# Altium integrated library Jesse_Library.IntLib: 1084 symbols (part 1 of 5) (continued)
## WJ500V_4PIN 5.08 (continued)
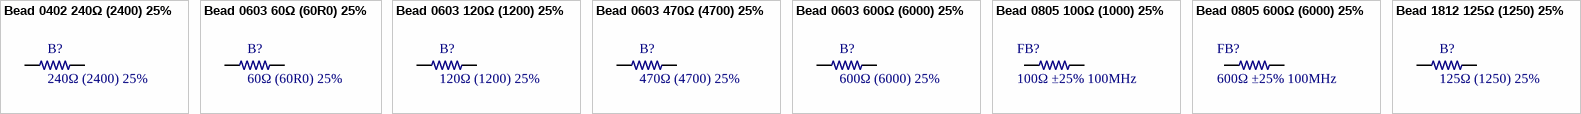
[diagram p4: symbols Bead 0402 240Ω (2400) 25% to Bead 1812 125Ω (1250) 25%]

## Bead 0402 240Ω (2400) 25%
designator B?, comment 240Ω (2400) 25%
贴片磁珠; Package: 0603; Supplier: LC; SuppliersPartNumber: C25803; ComponentLink1Description: 立创商城链接; ComponentLink1URL: https://item.szlcsc.com/266440.html
footprint 0402_L
pins: 1, 2

## Bead 0603 60Ω (60R0) 25%
designator B?, comment 60Ω (60R0) 25%
贴片磁珠; Package: 0603; Supplier: LC; SuppliersPartNumber: C25803; ComponentLink1Description: 立创商城链接; ComponentLink1URL: https://item.szlcsc.com/36300.html
footprint 0603_L
pins: 1, 2

## Bead 0603 120Ω (1200) 25%
designator B?, comment 120Ω (1200) 25%
贴片磁珠; Package: 0603; Supplier: LC; SuppliersPartNumber: C25803; ComponentLink1Description: 立创商城链接; ComponentLink1URL: https://item.szlcsc.com/19227.html
footprint 0603_L
pins: 1, 2

## Bead 0603 470Ω (4700) 25%
designator B?, comment 470Ω (4700) 25%
贴片磁珠; Package: 0603; Supplier: LC; SuppliersPartNumber: C25803; ComponentLink1Description: 立创商城链接; ComponentLink1URL: https://item.szlcsc.com/336340.html
footprint 0603_L
pins: 1, 2

## Bead 0603 600Ω (6000) 25%
designator B?, comment 600Ω (6000) 25%
贴片磁珠; Package: 0603; Supplier: LC; SuppliersPartNumber: C25803; ComponentLink1Description: 立创商城链接; ComponentLink1URL: https://item.szlcsc.com/1354.html
footprint 0603_L
pins: 1, 2

## Bead 0805 100Ω (1000) 25%
designator FB?, comment 100Ω ±25% 100MHz
贴片磁珠; Package: 0805; Supplier: LC; SuppliersPartNumber: C1015; ComponentLink1Description: 立创商城链接; ComponentLink1URL: https://item.szlcsc.com/1367.html
footprint 0805_L
pins: 1, 2

## Bead 0805 600Ω (6000) 25%
designator FB?, comment 600Ω ±25% 100MHz
贴片磁珠; Package: 0805; Supplier: LC; SuppliersPartNumber: C1017; ComponentLink1Description: 立创商城链接; ComponentLink1URL: https://item.szlcsc.com/99517.html
footprint 0805_L
pins: 1, 2

## Bead 1812 125Ω (1250) 25%
designator B?, comment 125Ω (1250) 25%
贴片磁珠; Package: 0603; Supplier: LC; SuppliersPartNumber: C25803; ComponentLink1Description: 立创商城链接; ComponentLink1URL: https://item.szlcsc.com/108534.html
footprint 1812_L
pins: 1, 2


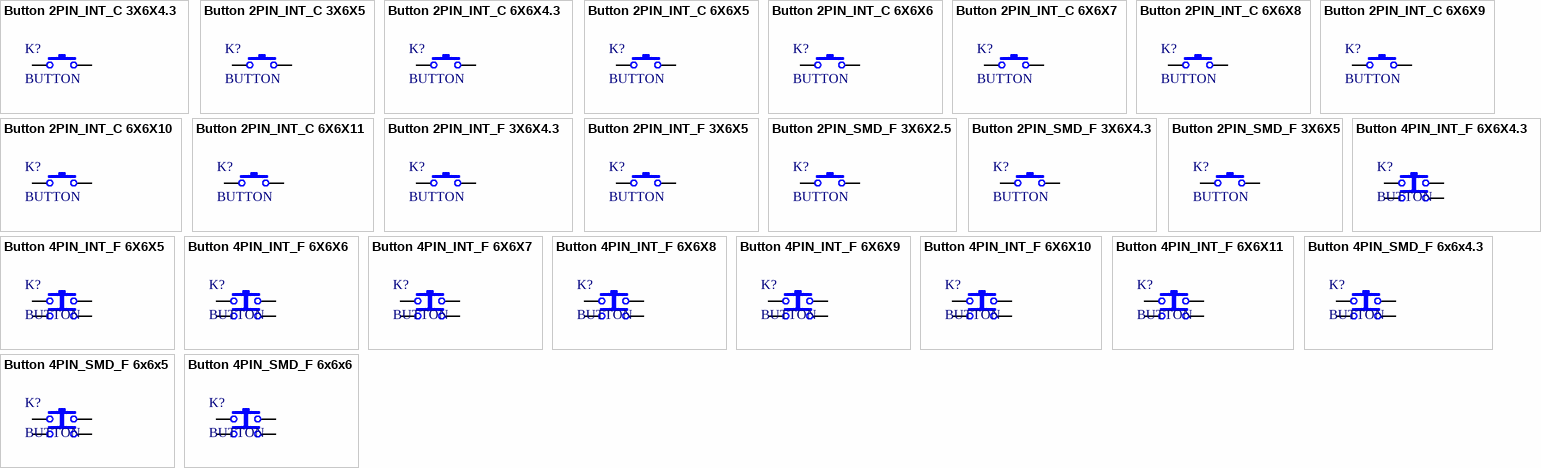
[diagram p5: symbols Button 2PIN_INT_C 3X6X4.3 to Button 4PIN_SMD_F 6x6x6]

## Button 2PIN_INT_C 3X6X4.3
designator K?, comment BUTTON
贴片按键
footprint KEY DIP3X6X4.3_C
pins: 1, 3

## Button 2PIN_INT_C 3X6X5
designator K?, comment BUTTON
贴片按键
footprint KEY DIP3X6X5_C
pins: 1, 3

## Button 2PIN_INT_C 6X6X4.3
designator K?, comment BUTTON
直插按键
footprint KEY DIP6X6X4.3_C
pins: 1, 3

## Button 2PIN_INT_C 6X6X5
designator K?, comment BUTTON
直插按键
footprint KEY DIP6X6X5_C
pins: 1, 3

## Button 2PIN_INT_C 6X6X6
designator K?, comment BUTTON
直插按键
footprint KEY DIP6X6X6_C
pins: 1, 3

## Button 2PIN_INT_C 6X6X7
designator K?, comment BUTTON
直插按键
footprint KEY DIP6X6X7_C
pins: 1, 3

## Button 2PIN_INT_C 6X6X8
designator K?, comment BUTTON
直插按键
footprint KEY DIP6X6X8_C
pins: 1, 3

## Button 2PIN_INT_C 6X6X9
designator K?, comment BUTTON
直插按键
footprint KEY DIP6X6X9_C
pins: 1, 3

## Button 2PIN_INT_C 6X6X10
designator K?, comment BUTTON
直插按键
footprint KEY DIP6X6X10_C
pins: 1, 3

## Button 2PIN_INT_C 6X6X11
designator K?, comment BUTTON
直插按键
footprint KEY DIP6X6X11_C
pins: 1, 3

## Button 2PIN_INT_F 3X6X4.3
designator K?, comment BUTTON
贴片按键
footprint KEY DIP3X6X4.3
pins: 1, 3

## Button 2PIN_INT_F 3X6X5
designator K?, comment BUTTON
贴片按键
footprint KEY DIP3X6X5
pins: 1, 3

## Button 2PIN_SMD_F 3X6X2.5
designator K?, comment BUTTON
贴片按键
footprint KEY SMD3X6X2.5
pins: 1, 3

## Button 2PIN_SMD_F 3X6X4.3
designator K?, comment BUTTON
贴片按键
footprint KEY SMD3X6X4.3
pins: 1, 3

## Button 2PIN_SMD_F 3X6X5
designator K?, comment BUTTON
贴片按键
footprint KEY SMD3X6X5
pins: 1, 3

## Button 4PIN_INT_F 6X6X4.3
designator K?, comment BUTTON
直插按键; ComponentLink1Description: 立创商城链接; ComponentLink1URL: https://item.szlcsc.com/270720.html
footprint KEY DIP6X6X4.3
pins: 1, 2, 3, 4

## Button 4PIN_INT_F 6X6X5
designator K?, comment BUTTON
直插按键; ComponentLink1Description: 立创商城链接; ComponentLink1URL: https://item.szlcsc.com/270722.html
footprint KEY DIP6X6X5
pins: 1, 2, 3, 4

## Button 4PIN_INT_F 6X6X6
designator K?, comment BUTTON
直插按键; ComponentLink1Description: 立创商城链接; ComponentLink1URL: https://item.szlcsc.com/279049.html
footprint KEY DIP6X6X6
pins: 1, 2, 3, 4

## Button 4PIN_INT_F 6X6X7
designator K?, comment BUTTON
直插按键; ComponentLink1Description: 立创商城链接; ComponentLink1URL: https://item.szlcsc.com/270723.html
footprint KEY DIP6X6X7
pins: 1, 2, 3, 4

## Button 4PIN_INT_F 6X6X8
designator K?, comment BUTTON
直插按键; ComponentLink1Description: 立创商城链接; ComponentLink1URL: https://item.szlcsc.com/279051.html
footprint KEY DIP6X6X8
pins: 1, 2, 3, 4

## Button 4PIN_INT_F 6X6X9
designator K?, comment BUTTON
直插按键; ComponentLink1Description: 立创商城链接; ComponentLink1URL: https://item.szlcsc.com/113223.html
footprint KEY DIP6X6X9
pins: 1, 2, 3, 4

## Button 4PIN_INT_F 6X6X10
designator K?, comment BUTTON
直插按键; ComponentLink1Description: 立创商城链接; ComponentLink1URL: https://item.szlcsc.com/279053.html
footprint KEY DIP6X6X10
pins: 1, 2, 3, 4

## Button 4PIN_INT_F 6X6X11
designator K?, comment BUTTON
直插按键
footprint KEY DIP6X6X11
pins: 1, 2, 3, 4

## Button 4PIN_SMD_F 6x6x4.3
designator K?, comment BUTTON
贴片按键; ComponentLink1Description: 立创商城链接; ComponentLink1URL: https://item.szlcsc.com/270721.html
footprint KEY SMD6X6X4.3
pins: 1, 2, 3, 4

## Button 4PIN_SMD_F 6x6x5
designator K?, comment BUTTON
贴片按键; ComponentLink1Description: 立创商城链接; ComponentLink1URL: https://item.szlcsc.com/279062.html
footprint KEY SMD6X6X5
pins: 1, 2, 3, 4

## Button 4PIN_SMD_F 6x6x6
designator K?, comment BUTTON
贴片按键; ComponentLink1Description: 立创商城链接; ComponentLink1URL: https://item.szlcsc.com/279063.html
footprint KEY SMD6X6X6
pins: 1, 2, 3, 4


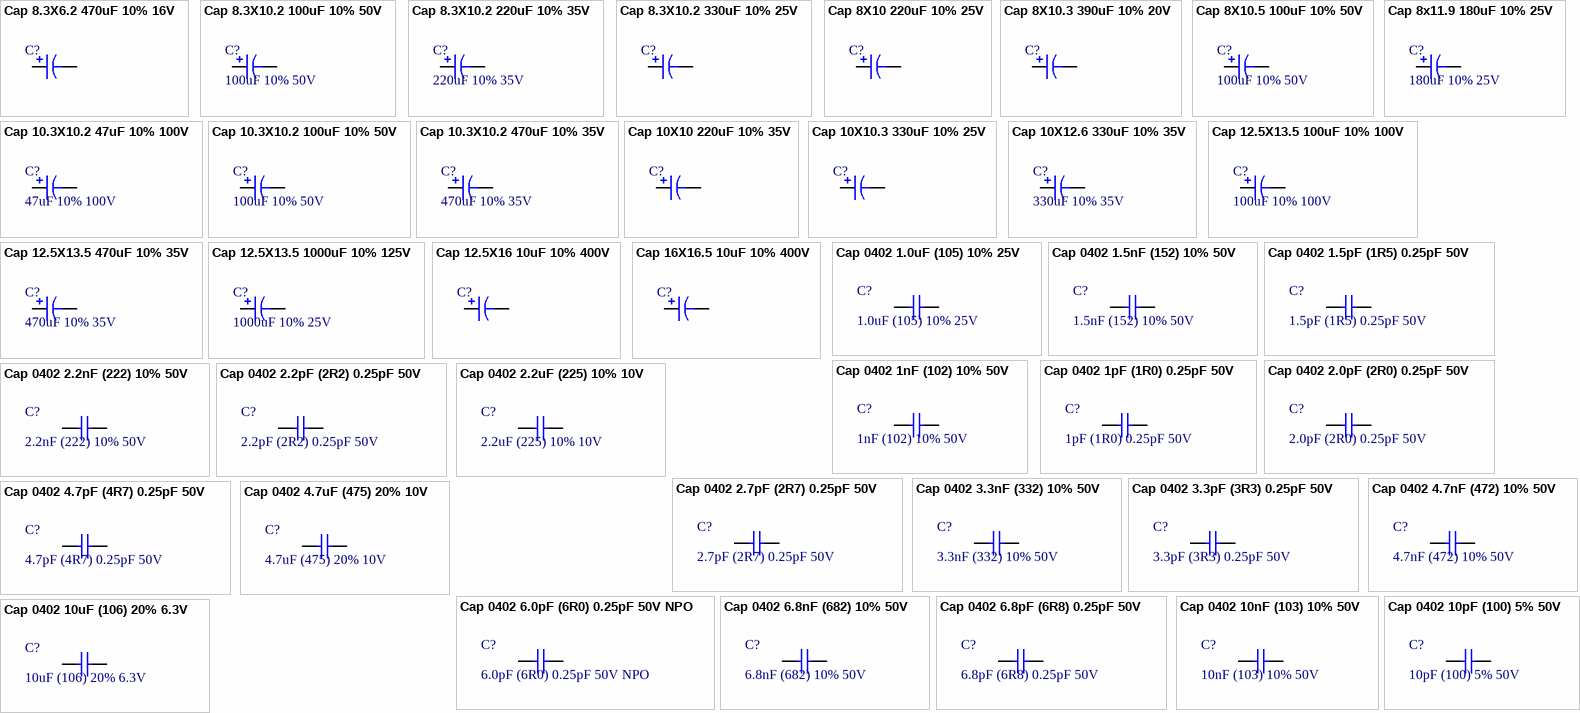
[diagram p6: symbols Cap 8.3X6.2 470uF 10% 16V to Cap 0402 10uF (106) 20% 6.3V]

## Cap 8.3X6.2 470uF 10% 16V
designator C?
贴片电解电容
footprint CAP SMT 8.3X6.2 (Capacitor, Aluminium Electrolytric, 8.3mm L X 8.3mm W X 6.2mm H, IPC Medium Density)
pins: 1, 2

## Cap 8.3X10.2 100uF 10% 50V
designator C?, comment 100uF 10% 50V
贴片电解电容
footprint CAP SMT 8.3X10.2 (Capacitor, Aluminium Electrolytric, 8.3mm L X 8.3mm W X 10.2mm H, IPC Medium Density)
pins: 1, 2

## Cap 8.3X10.2 220uF 10% 35V
designator C?, comment 220uF 10% 35V
贴片电解电容
footprint CAP SMT 8.3X10.2 (Capacitor, Aluminium Electrolytric, 8.3mm L X 8.3mm W X 10.2mm H, IPC Medium Density)
pins: 1, 2

## Cap 8.3X10.2 330uF 10% 25V
designator C?
贴片电解电容
footprint CAP SMT 8.3X10.2 (Capacitor, Aluminium Electrolytric, 8.3mm L X 8.3mm W X 10.2mm H, IPC Medium Density)
pins: 1, 2

## Cap 8X10 220uF 10% 25V
designator C?
贴片电解电容
footprint CAP SMT 8X10
pins: 1, 2

## Cap 8X10.3 390uF 10% 20V
designator C?
贴片电解电容
footprint CAP SMT 8X10.3
pins: 1, 2

## Cap 8X10.5 100uF 10% 50V
designator C?, comment 100uF 10% 50V
贴片电解电容
footprint CAP SMT 8X10.5
pins: 1, 2

## Cap 8x11.9 180uF 10% 25V
designator C?, comment 180uF 10% 25V
贴片电解电容
footprint CAP SMT 8X10.5
pins: 1, 2

## Cap 10.3X10.2 47uF 10% 100V
designator C?, comment 47uF 10% 100V
贴片电解电容
footprint CAP SMT 10.3X10.2 (Capacitor, Aluminium Electrolytric, 10.3mm L X 10.3mm W X 10.2mm H, IPC Medium Density)
pins: 1, 2

## Cap 10.3X10.2 100uF 10% 50V
designator C?, comment 100uF 10% 50V
贴片电解电容
footprint CAP SMT 10.3X10.2 (Capacitor, Aluminium Electrolytric, 10.3mm L X 10.3mm W X 10.2mm H, IPC Medium Density)
pins: 1, 2

## Cap 10.3X10.2 470uF 10% 35V
designator C?, comment 470uF 10% 35V
贴片电解电容
footprint CAP SMT 10.3X10.2 (Capacitor, Aluminium Electrolytric, 10.3mm L X 10.3mm W X 10.2mm H, IPC Medium Density)
pins: 1, 2

## Cap 10X10 220uF 10% 35V
designator C?
贴片电解电容
footprint CAP SMT 10X10
pins: 1, 2

## Cap 10X10.3 330uF 10% 25V
designator C?
贴片电解电容
footprint CAP SMT 10X10.3
pins: 1, 2

## Cap 10X12.6 330uF 10% 35V
designator C?, comment 330uF 10% 35V
贴片固态电解电容
footprint CAP SMT 10X12.6
pins: 1, 2

## Cap 12.5X13.5 100uF 10% 100V
designator C?, comment 100uF 10% 100V
贴片电解电容
footprint CAP SMT 12.5X13.5
pins: 1, 2

## Cap 12.5X13.5 470uF 10% 35V
designator C?, comment 470uF 10% 35V
贴片电解电容
footprint CAP SMT 12.5X13.5
pins: 1, 2

## Cap 12.5X13.5 1000uF 10% 125V
designator C?, comment 1000uF 10% 25V
贴片电解电容
footprint CAP SMT 12.5X13.5
pins: 1, 2

## Cap 12.5X16 10uF 10% 400V
designator C?
贴片电解电容
footprint CAP SMT 12.5X16
pins: 1, 2

## Cap 16X16.5 10uF 10% 400V
designator C?
贴片电解电容
footprint CAP SMT 16X16.5
pins: 1, 2

## Cap 0402 1.0uF (105) 10% 25V
designator C?, comment 1.0uF (105) 10% 25V
贴片电容; ComponentLink1Description: 供应商链接; ComponentLink1URL: http://www.szlcsc.com/product/details_53938.html; Package: 0402; Supplier: LC; SuppliersPartNumber: C52923
footprint 0402_C
pins: 1, 2

## Cap 0402 1.5nF (152) 10% 50V
designator C?, comment 1.5nF (152) 10% 50V
贴片电容; ComponentLink1Description: 供应商链接; ComponentLink1URL: http://www.szlcsc.com/product/details_24707.html; Package: 0402; Supplier: LC; SuppliersPartNumber: C23967
footprint 0402_C
pins: 1, 2

## Cap 0402 1.5pF (1R5) 0.25pF 50V
designator C?, comment 1.5pF (1R5) 0.25pF 50V
贴片电容; ComponentLink1Description: 供应商链接; ComponentLink1URL: http://www.szlcsc.com/product/details_1904.html; Package: 0402; Supplier: LC; SuppliersPartNumber: C1552
footprint 0402_C
pins: 1, 2

## Cap 0402 1nF (102) 10% 50V
designator C?, comment 1nF (102) 10% 50V
贴片电容; ComponentLink1Description: 供应商链接; ComponentLink1URL: http://www.szlcsc.com/product/details_1875.html; Package: 0402; Supplier: LC; SuppliersPartNumber: C1523
footprint 0402_C
pins: 1, 2

## Cap 0402 1pF (1R0) 0.25pF 50V
designator C?, comment 1pF (1R0) 0.25pF 50V
贴片电容; ComponentLink1Description: 供应商链接; ComponentLink1URL: http://www.szlcsc.com/product/details_1902.html; Package: 0402; Supplier: LC; SuppliersPartNumber: C1550
footprint 0402_C
pins: 1, 2

## Cap 0402 2.0pF (2R0) 0.25pF 50V
designator C?, comment 2.0pF (2R0) 0.25pF 50V
贴片电容; ComponentLink1Description: 供应商链接; ComponentLink1URL: http://www.szlcsc.com/product/details_1910.html; Package: 0402; Supplier: LC; SuppliersPartNumber: C1558
footprint 0402_C
pins: 1, 2

## Cap 0402 2.2nF (222) 10% 50V
designator C?, comment 2.2nF (222) 10% 50V
贴片电容; ComponentLink1Description: 供应商链接; ComponentLink1URL: http://www.szlcsc.com/product/details_1883.html; Package: 0402; Supplier: LC; SuppliersPartNumber: C1531
footprint 0402_C
pins: 1, 2

## Cap 0402 2.2pF (2R2) 0.25pF 50V
designator C?, comment 2.2pF (2R2) 0.25pF 50V
贴片电容; ComponentLink1Description: 供应商链接; ComponentLink1URL: http://www.szlcsc.com/product/details_1911.html; Package: 0402; Supplier: LC; SuppliersPartNumber: C1559
footprint 0402_C
pins: 1, 2

## Cap 0402 2.2uF (225) 10% 10V
designator C?, comment 2.2uF (225) 10% 10V
贴片电容; Package: 0402; Supplier: LC; SuppliersPartNumber: C1538; ComponentLink1Description: 立创商城链接; ComponentLink1URL: https://item.szlcsc.com/78129.html
footprint 0402_C
pins: 1, 2

## Cap 0402 2.7pF (2R7) 0.25pF 50V
designator C?, comment 2.7pF (2R7) 0.25pF 50V
贴片电容; ComponentLink1Description: 供应商链接; ComponentLink1URL: http://www.szlcsc.com/product/details_1913.html; Package: 0402; Supplier: LC; SuppliersPartNumber: C1561
footprint 0402_C
pins: 1, 2

## Cap 0402 3.3nF (332) 10% 50V
designator C?, comment 3.3nF (332) 10% 50V
贴片电容; ComponentLink1Description: 供应商链接; ComponentLink1URL: http://www.szlcsc.com/product/details_27148.html; Package: 0402; Supplier: LC; SuppliersPartNumber: C26404
footprint 0402_C
pins: 1, 2

## Cap 0402 3.3pF (3R3) 0.25pF 50V
designator C?, comment 3.3pF (3R3) 0.25pF 50V
贴片电容; ComponentLink1Description: 供应商链接; ComponentLink1URL: http://www.szlcsc.com/product/details_1917.html; Package: 0402; Supplier: LC; SuppliersPartNumber: C1565
footprint 0402_C
pins: 1, 2

## Cap 0402 4.7nF (472) 10% 50V
designator C?, comment 4.7nF (472) 10% 50V
贴片电容; ComponentLink1Description: 供应商链接; ComponentLink1URL: http://www.szlcsc.com/product/details_1890.html; Package: 0402; Supplier: LC; SuppliersPartNumber: C1538
footprint 0402_C
pins: 1, 2

## Cap 0402 4.7pF (4R7) 0.25pF 50V
designator C?, comment 4.7pF (4R7) 0.25pF 50V
贴片电容; ComponentLink1Description: 供应商链接; ComponentLink1URL: http://www.szlcsc.com/product/details_1921.html; Package: 0402; Supplier: LC; SuppliersPartNumber: C1569
footprint 0402_C
pins: 1, 2

## Cap 0402 4.7uF (475) 20% 10V
designator C?, comment 4.7uF (475) 20% 10V
贴片电容; ComponentLink1Description: 供应商链接; ComponentLink1URL: http://www.szlcsc.com/product/details_24469.html; Package: 0402; Supplier: LC; SuppliersPartNumber: C23733
footprint 0402_C
pins: 1, 2

## Cap 0402 6.0pF (6R0) 0.25pF 50V NPO
designator C?, comment 6.0pF (6R0) 0.25pF 50V NPO
贴片电容; ComponentLink1Description: 供应商链接; ComponentLink1URL: http://www.szlcsc.com/product/details_31031.html; Package: 0402; Supplier: LC; SuppliersPartNumber: C30274
footprint 0402_C
pins: 1, 2

## Cap 0402 6.8nF (682) 10% 50V
designator C?, comment 6.8nF (682) 10% 50V
贴片电容; ComponentLink1Description: 供应商链接; ComponentLink1URL: http://www.szlcsc.com/product/details_1894.html; Package: 0402; Supplier: LC; SuppliersPartNumber: C1542
footprint 0402_C
pins: 1, 2

## Cap 0402 6.8pF (6R8) 0.25pF 50V
designator C?, comment 6.8pF (6R8) 0.25pF 50V
贴片电容; ComponentLink1Description: 供应商链接; ComponentLink1URL: http://www.szlcsc.com/product/details_1928.html; Package: 0402; Supplier: LC; SuppliersPartNumber: C1576
footprint 0402_C
pins: 1, 2

## Cap 0402 10nF (103) 10% 50V
designator C?, comment 10nF (103) 10% 50V
贴片电容; ComponentLink1Description: 供应商链接; ComponentLink1URL: http://www.szlcsc.com/product/details_15869.html; Package: 0402; Supplier: LC; SuppliersPartNumber: C15195
footprint 0402_C
pins: 1, 2

## Cap 0402 10pF (100) 5% 50V
designator C?, comment 10pF (100) 5% 50V
贴片电容; ComponentLink1Description: 供应商链接; ComponentLink1URL: http://www.szlcsc.com/product/details_33914.html; Package: 0402; Supplier: LC; SuppliersPartNumber: C32949
footprint 0402_C
pins: 1, 2

## Cap 0402 10uF (106) 20% 6.3V
designator C?, comment 10uF (106) 20% 6.3V
贴片电容; ComponentLink1Description: 供应商链接; ComponentLink1URL: http://www.szlcsc.com/product/details_16204.html; Package: 0402; Supplier: LC; SuppliersPartNumber: C15525
footprint 0402_C
pins: 1, 2

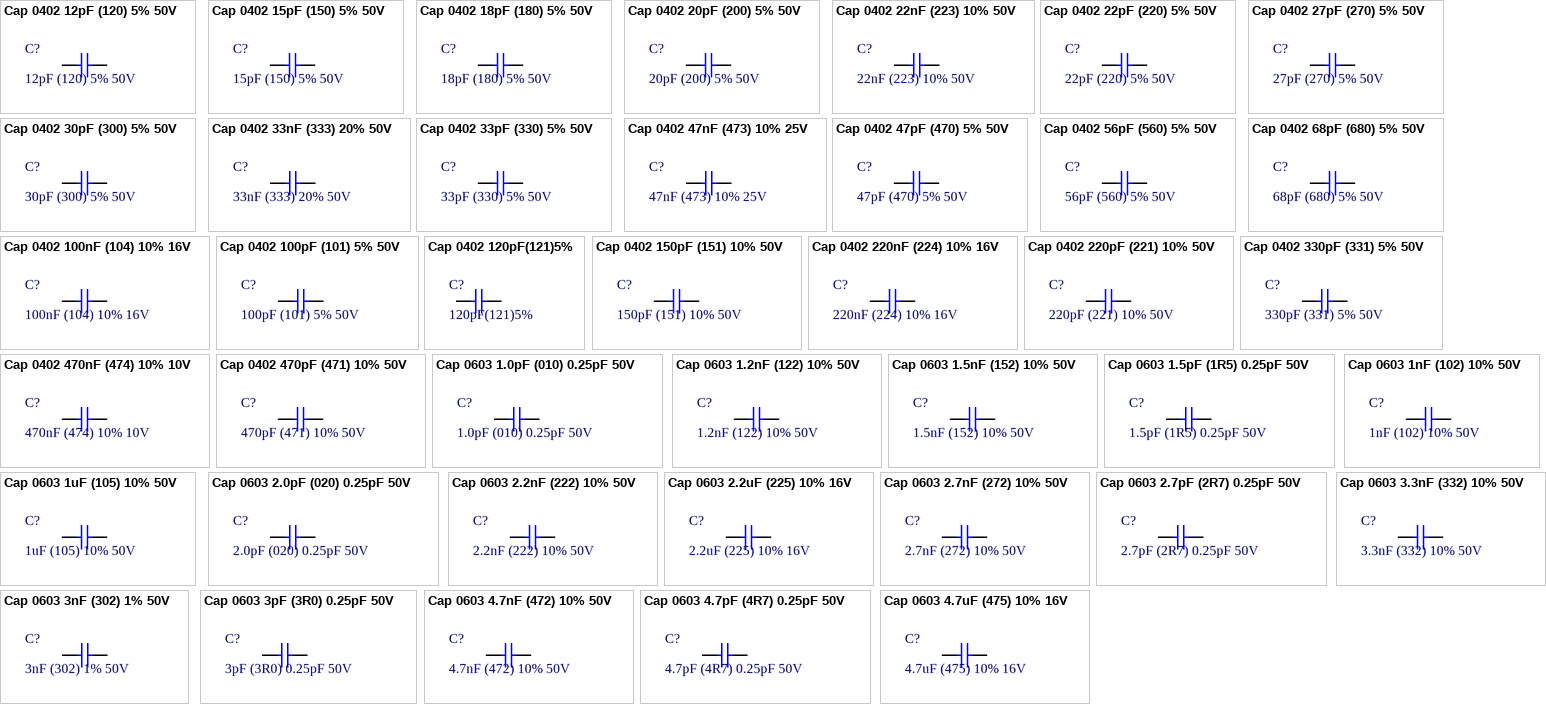
[diagram p7: symbols Cap 0402 12pF (120) 5% 50V to Cap 0603 4.7uF (475) 10% 16V]

## Cap 0402 12pF (120) 5% 50V
designator C?, comment 12pF (120) 5% 50V
贴片电容; ComponentLink1Description: 供应商链接; ComponentLink1URL: http://www.szlcsc.com/product/details_1899.html; Package: 0402; Supplier: LC; SuppliersPartNumber: C1547
footprint 0402_C
pins: 1, 2

## Cap 0402 15pF (150) 5% 50V
designator C?, comment 15pF (150) 5% 50V
贴片电容; ComponentLink1Description: 供应商链接; ComponentLink1URL: http://www.szlcsc.com/product/details_1900.html; Package: 0402; Supplier: LC; SuppliersPartNumber: C1548
footprint 0402_C
pins: 1, 2

## Cap 0402 18pF (180) 5% 50V
designator C?, comment 18pF (180) 5% 50V
贴片电容; ComponentLink1Description: 供应商链接; ComponentLink1URL: http://www.szlcsc.com/product/details_1901.html; Package: 0402; Supplier: LC; SuppliersPartNumber: C1549
footprint 0402_C
pins: 1, 2

## Cap 0402 20pF (200) 5% 50V
designator C?, comment 20pF (200) 5% 50V
贴片电容; ComponentLink1Description: 供应商链接; ComponentLink1URL: http://www.szlcsc.com/product/details_1906.html; Package: 0402; Supplier: LC; SuppliersPartNumber: C1554
footprint 0402_C
pins: 1, 2

## Cap 0402 22nF (223) 10% 50V
designator C?, comment 22nF (223) 10% 50V
贴片电容; ComponentLink1Description: 供应商链接; ComponentLink1URL: http://www.szlcsc.com/product/details_1884.html; Package: 0402; Supplier: LC; SuppliersPartNumber: C1532
footprint 0402_C
pins: 1, 2

## Cap 0402 22pF (220) 5% 50V
designator C?, comment 22pF (220) 5% 50V
贴片电容; ComponentLink1Description: 供应商链接; ComponentLink1URL: http://www.szlcsc.com/product/details_1907.html; Package: 0402; Supplier: LC; SuppliersPartNumber: C1555
footprint 0402_C
pins: 1, 2

## Cap 0402 27pF (270) 5% 50V
designator C?, comment 27pF (270) 5% 50V
贴片电容; ComponentLink1Description: 供应商链接; ComponentLink1URL: http://www.szlcsc.com/product/details_1909.html; Package: 0402; Supplier: LC; SuppliersPartNumber: C1557
footprint 0402_C
pins: 1, 2

## Cap 0402 30pF (300) 5% 50V
designator C?, comment 30pF (300) 5% 50V
贴片电容; ComponentLink1Description: 供应商链接; ComponentLink1URL: http://www.szlcsc.com/product/details_1922.html; Package: 0402; Supplier: LC; SuppliersPartNumber: C1570
footprint 0402_C
pins: 1, 2

## Cap 0402 33nF (333) 20% 50V
designator C?, comment 33nF (333) 20% 50V
贴片电容; ComponentLink1Description: 供应商链接; ComponentLink1URL: http://www.szlcsc.com/product/details_1937.html; Package: 0402; Supplier: LC; SuppliersPartNumber: C1585
footprint 0402_C
pins: 1, 2

## Cap 0402 33pF (330) 5% 50V
designator C?, comment 33pF (330) 5% 50V
贴片电容; ComponentLink1Description: 供应商链接; ComponentLink1URL: http://www.szlcsc.com/product/details_1914.html; Package: 0402; Supplier: LC; SuppliersPartNumber: C1562
footprint 0402_C
pins: 1, 2

## Cap 0402 47nF (473) 10% 25V
designator C?, comment 47nF (473) 10% 25V
贴片电容; Package: 0402; Supplier: LC; SuppliersPartNumber: C15195; ComponentLink1Description: 立创商城链接; ComponentLink1URL: https://item.szlcsc.com/78144.html
footprint 0402_C
pins: 1, 2

## Cap 0402 47pF (470) 5% 50V
designator C?, comment 47pF (470) 5% 50V
贴片电容; ComponentLink1Description: 供应商链接; ComponentLink1URL: http://www.szlcsc.com/product/details_1919.html; Package: 0402; Supplier: LC; SuppliersPartNumber: C1567
footprint 0402_C
pins: 1, 2

## Cap 0402 56pF (560) 5% 50V
designator C?, comment 56pF (560) 5% 50V
贴片电容; ComponentLink1Description: 供应商链接; ComponentLink1URL: http://www.szlcsc.com/product/details_1924.html; Package: 0402; Supplier: LC; SuppliersPartNumber: C1572
footprint 0402_C
pins: 1, 2

## Cap 0402 68pF (680) 5% 50V
designator C?, comment 68pF (680) 5% 50V
贴片电容; ComponentLink1Description: 供应商链接; ComponentLink1URL: http://www.szlcsc.com/product/details_15103.html; Package: 0402; Supplier: LC; SuppliersPartNumber: C14441
footprint 0402_C
pins: 1, 2

## Cap 0402 100nF (104) 10% 16V
designator C?, comment 100nF (104) 10% 16V
贴片电容; ComponentLink1Description: 供应商链接; ComponentLink1URL: http://www.szlcsc.com/product/details_1877.html; Package: 0402; Supplier: LC; SuppliersPartNumber: C1525
footprint 0402_C
pins: 1, 2

## Cap 0402 100pF (101) 5% 50V
designator C?, comment 100pF (101) 5% 50V
贴片电容; ComponentLink1Description: 供应商链接; ComponentLink1URL: http://www.szlcsc.com/product/details_1898.html; Package: 0402; Supplier: LC; SuppliersPartNumber: C1546
footprint 0402_C
pins: 1, 2

## Cap 0402 120pF(121)5%
designator C?, comment 120pF(121)5%
贴片电容
footprint 0402_C
pins: 1, 2

## Cap 0402 150pF (151) 10% 50V
designator C?, comment 150pF (151) 10% 50V
贴片电容; ComponentLink1Description: 供应商链接; ComponentLink1URL: http://www.szlcsc.com/product/details_1879.html; Package: 0402; Supplier: LC; SuppliersPartNumber: C1527
footprint 0402_C
pins: 1, 2

## Cap 0402 220nF (224) 10% 16V
designator C?, comment 220nF (224) 10% 16V
贴片电容; ComponentLink1Description: 供应商链接; ComponentLink1URL: http://www.szlcsc.com/product/details_17456.html; Package: 0402; Supplier: LC; SuppliersPartNumber: C16772
footprint 0402_C
pins: 1, 2

## Cap 0402 220pF (221) 10% 50V
designator C?, comment 220pF (221) 10% 50V
贴片电容; ComponentLink1Description: 供应商链接; ComponentLink1URL: http://www.szlcsc.com/product/details_1882.html; Package: 0402; Supplier: LC; SuppliersPartNumber: C1530
footprint 0402_C
pins: 1, 2

## Cap 0402 330pF (331) 5% 50V
designator C?, comment 330pF (331) 5% 50V
贴片电容; ComponentLink1Description: 供应商链接; ComponentLink1URL: http://www.szlcsc.com/product/details_14182.html; Package: 0402; Supplier: LC; SuppliersPartNumber: C13533
footprint 0402_C
pins: 1, 2

## Cap 0402 470nF (474) 10% 10V
designator C?, comment 470nF (474) 10% 10V
贴片电容; ComponentLink1Description: 供应商链接; ComponentLink1URL: http://www.szlcsc.com/product/details_48344.html; Package: 0402; Supplier: LC; SuppliersPartNumber: C47339
footprint 0402_C
pins: 1, 2

## Cap 0402 470pF (471) 10% 50V
designator C?, comment 470pF (471) 10% 50V
贴片电容; ComponentLink1Description: 供应商链接; ComponentLink1URL: http://www.szlcsc.com/product/details_1889.html; Package: 0402; Supplier: LC; SuppliersPartNumber: C1537
footprint 0402_C
pins: 1, 2

## Cap 0603 1.0pF (010) 0.25pF 50V
designator C?, comment 1.0pF (010) 0.25pF 50V
贴片电容; ComponentLink1Description: 供应商链接; ComponentLink1URL: http://www.szlcsc.com/product/details_24709.html; Package: 0603; Supplier: LC; SuppliersPartNumber: C23969
footprint 0603_C
pins: 1, 2

## Cap 0603 1.2nF (122) 10% 50V
designator C?, comment 1.2nF (122) 10% 50V
贴片电容; ComponentLink1Description: 供应商链接; ComponentLink1URL: http://www.szlcsc.com/product/details_31372.html; Package: 0603; Supplier: LC; SuppliersPartNumber: C30615
footprint 0603_C
pins: 1, 2
